# Altium footprint library myPcb.PcbLib: 145 footprints (part 7 of 10)
Each footprint in its own frame and in the unit in brackets; x right, y up, seen from the top. Pads: shape width x height; smd on the part's side, far side on the other; paste and mask are expansions set on the pad; w line width, h text height; cw(c..) or ccw(c..) is an arc to the next point about the centre after c.
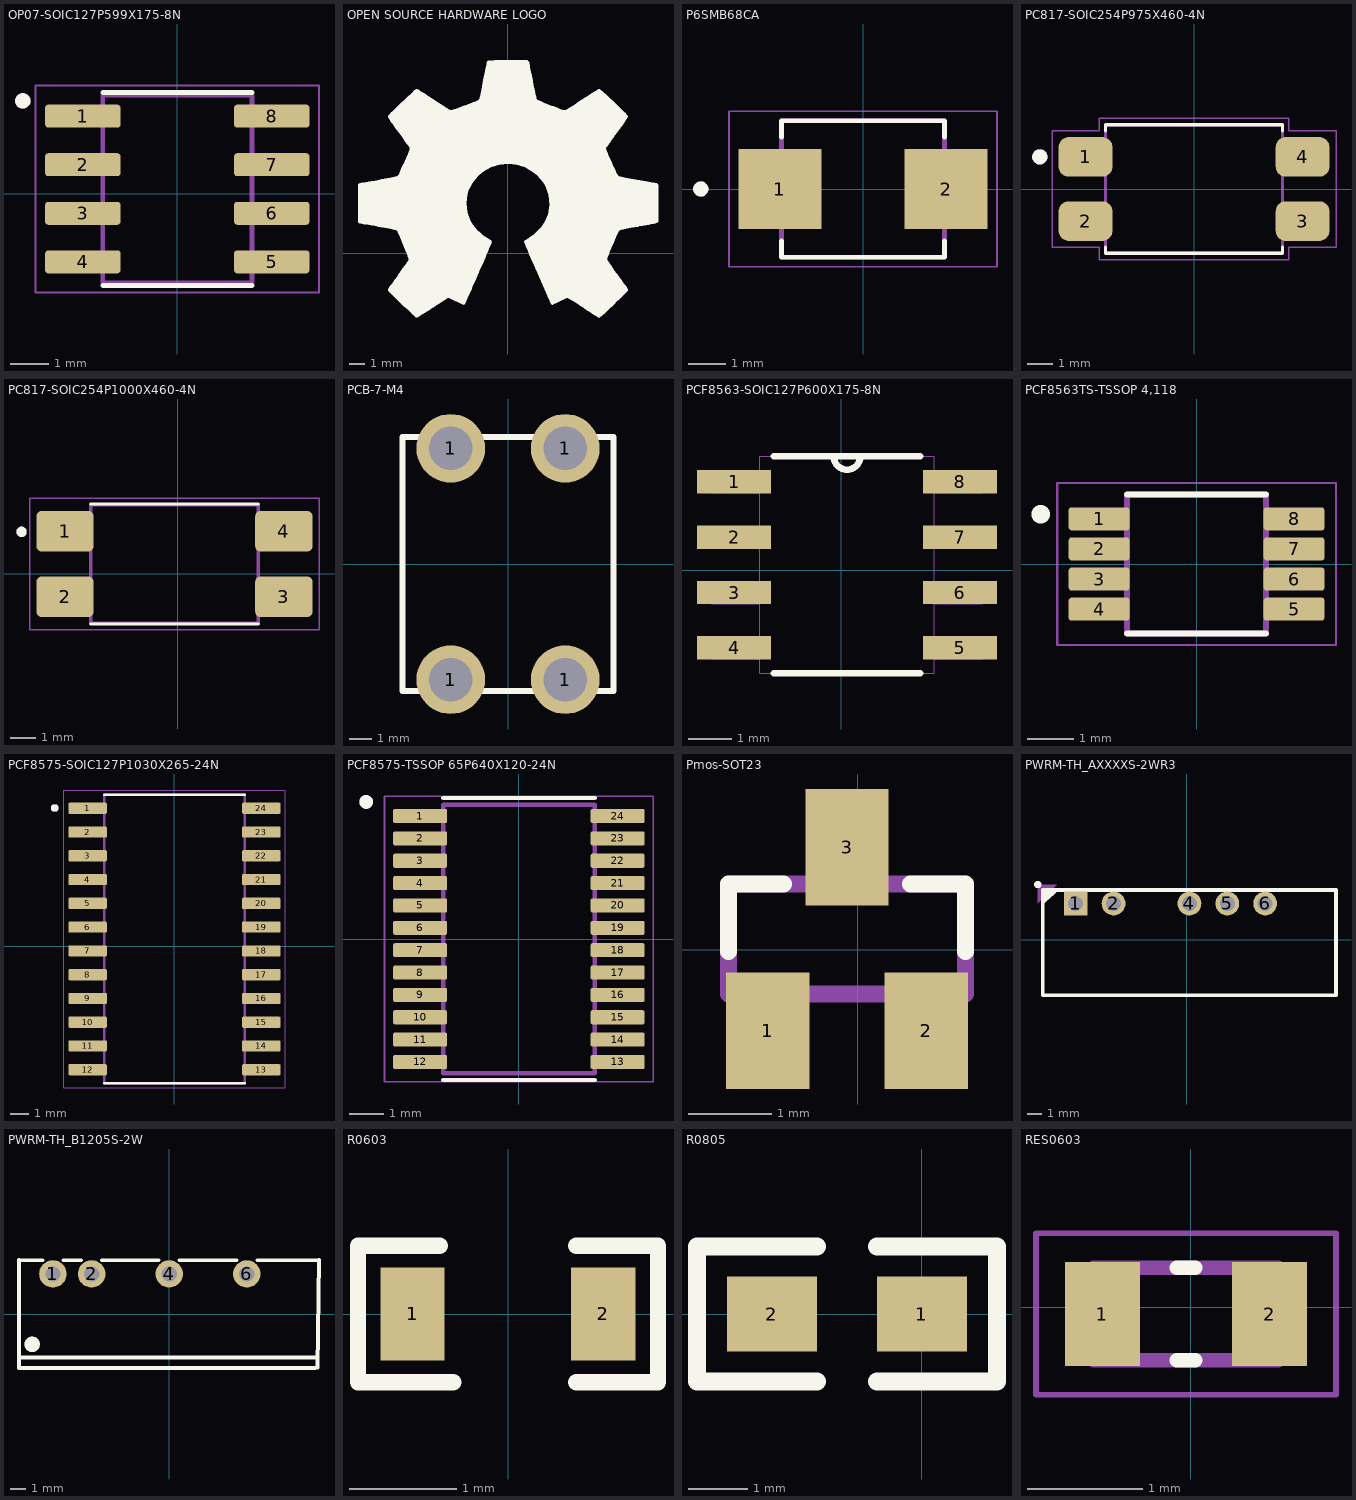
[diagram p6: the footprints below, top view; thin cyan lines are the x and y axes]

## OP07-SOIC127P599X175-8N [mm] "OP07"
pads (8):
  rrect25% 1.97x0.6 smd: 1(-2.47,2.032) 2(-2.47,0.762) 3(-2.47,-0.508) 4(-2.47,-1.778) 5(2.47,-1.778) 6(2.47,-0.508) 7(2.47,0.762) 8(2.47,2.032)
Top Overlay:
  circle w0.2: c-4.04,2.432 r0.1
  lines w0.127: -1.95,-2.398 1.95,-2.398 ; -1.95,2.652 1.95,2.652
Mechanical 13:
  circle w0.2: c-4.04,2.432 r0.1
  lines w0.127: -1.95,-2.325 1.95,-2.325 1.95,2.579 -1.95,2.579 -1.95,-2.325
Mechanical 15:
  lines w0.05: -3.705,-2.575 3.705,-2.575 3.705,2.829 -3.705,2.829 -3.705,-2.575

## OPEN SOURCE HARDWARE LOGO [mm]
Top Overlay:
  drawing of 1 lines, arcs and shapes, not listed

## P6SMB68CA [mm]
pads (2):
  rect 2.2x2.12 smd: 1(-2.205,0) 2(2.205,0)
Top Overlay:
  circle w0.2: c-4.305,0 r0.1
  lines w0.127: -2.163,-1.38 -2.163,-1.813 2.163,-1.813 2.163,-1.38 ; -2.163,1.38 -2.163,1.813 2.163,1.813 2.163,1.38
Mechanical 13:
  circle w0.2: c-4.305,0 r0.1
  lines w0.127: -2.163,-1.813 -2.163,1.813 2.163,1.813 2.163,-1.813 -2.163,-1.813
Mechanical 15:
  lines w0.05: -3.555,-2.063 -3.555,2.063 3.555,2.063 3.555,-2.063 -3.555,-2.063
3D body "step_temp.STEP": height 2.65, standoff 0, extent -2.675,-1.813 2.675,1.813

## PC817-SOIC254P975X460-4N [mm] "PC817"
pads (4):
  rrect50% 2.13x1.57 smd: 1(-4.29,1.27) 2(-4.29,-1.27) 3(4.29,-1.27) 4(4.29,1.27)
Top Overlay:
  circle w0.3: c-6.1,1.27 r0.15
  lines w0.127: -3.5,-2.304 -3.5,-2.54 3.5,-2.54 3.5,-2.304 ; -3.5,2.304 -3.5,2.54 3.5,2.54 3.5,2.304
Mechanical 13:
  circle w0.3: c-6.1,1.27 r0.15
  lines w0.127: -3.5,-2.54 3.5,-2.54 3.5,2.54 -3.5,2.54 -3.5,-2.54
Mechanical 15:
  lines w0.05: -5.61,-2.31 -3.75,-2.31 -3.75,-2.79 3.75,-2.79 3.75,-2.31 5.61,-2.31 5.61,2.31 3.75,2.31 3.75,2.79 -3.75,2.79 -3.75,2.31 -5.61,2.31 -5.61,-2.31

## PC817-SOIC254P1000X460-4N [mm] "PC817"
pads (4):
  rrect25% 2.22x1.57 smd: 1(-4.372,1.651) 2(-4.372,-0.889) 3(4.118,-0.889) 4(4.118,1.651)
Top Overlay:
  circle w0.2: c-6.057,1.628 r0.1
  lines w0.127: -3.377,-1.949 3.123,-1.949 ; -3.377,2.711 3.123,2.711
Mechanical 13:
  circle w0.2: c-6.057,1.628 r0.1
  lines w0.127: -3.377,-1.909 -3.377,2.671 3.123,2.671 3.123,-1.909 -3.377,-1.909
Mechanical 15:
  lines w0.05: -5.737,-2.169 -5.737,2.931 5.483,2.931 5.483,-2.169 -5.737,-2.169

## PCB-7-M4 [mm] "PCB安装4脚金属接线端子"
pads (4):
  round 3 hole 1.9 paste+0 mask+0.2: 1(-2.5,-5.05) 1(-2.5,5.05) 1(2.5,-5.05) 1(2.5,5.05)
Top Overlay:
  lines w0.254: -4.6,-5.55 4.6,-5.55 4.6,5.55 -4.6,5.55 -4.6,-5.55
Bottom Overlay:
  lines w0.254: -4.6,-5.55 4.6,-5.55 4.6,5.55 -4.6,5.55 -4.6,-5.55

## PCF8563-SOIC127P600X175-8N [mil] "PCF8563"
pads (8):
  rect 67x21 smd: 1(-97,80) 2(-97,30) 3(-97,-20) 4(-97,-70) 5(107,-70) 6(107,-20) 7(107,30) 8(107,80)
Top Overlay:
  lines w6: -61,-93 71,-93 ; -61,103 -7,103 ; 71,103 17,103 ; -7,103 ccw(c5,103) 17,103 ; -7,103 17,103
Mechanical 13:
  lines w0: -7,103 ccw(c5,103) 17,103 ; -7,103 -74,103 -74,-93 84,-93 84,103 17,103 ; -7,103 17,103 ; -117,-80 -74,-80 -74,-60 -117,-60 -117,-80 ; -117,-30 -74,-30 -74,-10 -117,-10 -117,-30 ; -117,20 -74,20 -74,40 -117,40 -117,20 ; -117,70 -74,70 -74,90 -117,90 -117,70 ; 84,-80 127,-80 127,-60 84,-60 84,-80 ; 84,-30 127,-30 127,-10 84,-10 84,-30 ; 84,20 127,20 127,40 84,40 84,20 ; 84,70 127,70 127,90 84,90 84,70

## PCF8563TS-TSSOP 4,118 [mm]
pads (8):
  rrect25% 1.31x0.5 smd: 1(-2.105,0.975) 2(-2.105,0.325) 3(-2.105,-0.325) 4(-2.105,-0.975) 5(2.105,-0.975) 6(2.105,-0.325) 7(2.105,0.325) 8(2.105,0.975)
Top Overlay:
  circle w0.2: c-3.366,1.074 r0.1
  lines w0.127: -1.5,-1.5 1.5,-1.5 ; -1.5,1.5 1.5,1.5
Mechanical 13:
  lines w0.127: -1.5,-1.5 -1.5,1.5 1.5,1.5 1.5,-1.5 -1.5,-1.5
Mechanical 15:
  lines w0.05: -3.01,-1.75 -3.01,1.75 3.01,1.75 3.01,-1.75 -3.01,-1.75

## PCF8575-SOIC127P1030X265-24N [mm] "PCF8575"
pads (24):
  rrect25% 2.06x0.6 smd: 1(-4.64,7.366) 2(-4.64,6.096) 3(-4.64,4.826) 4(-4.64,3.556) 5(-4.64,2.286) 6(-4.64,1.016) 7(-4.64,-0.254) 8(-4.64,-1.524) 9(-4.64,-2.794) 10(-4.64,-4.064) 11(-4.64,-5.334) 12(-4.64,-6.604) 13(4.64,-6.604) 14(4.64,-5.334) 15(4.64,-4.064) 16(4.64,-2.794) 17(4.64,-1.524) 18(4.64,-0.254) 19(4.64,1.016) 20(4.64,2.286) 21(4.64,3.556) 22(4.64,4.826) 23(4.64,6.096) 24(4.64,7.366)
Top Overlay:
  circle w0.2: c-6.4,7.381 r0.1
  lines w0.127: -3.75,-7.319 3.75,-7.319 ; -3.75,8.081 3.75,8.081
Mechanical 13:
  circle w0.2: c-6.4,7.381 r0.1
  lines w0.127: -3.75,-7.319 -3.75,8.081 3.75,8.081 3.75,-7.319 -3.75,-7.319
Mechanical 15:
  lines w0.05: -5.92,-7.569 -5.92,8.331 5.92,8.331 5.92,-7.569 -5.92,-7.569

## PCF8575-TSSOP 65P640X120-24N [mm]
pads (24):
  rrect25% 1.57x0.41 smd: 1(-2.87,3.575) 2(-2.87,2.925) 3(-2.87,2.275) 4(-2.87,1.625) 5(-2.87,0.975) 6(-2.87,0.325) 7(-2.87,-0.325) 8(-2.87,-0.975) 9(-2.87,-1.625) 10(-2.87,-2.275) 11(-2.87,-2.925) 12(-2.87,-3.575) 13(2.87,-3.575) 14(2.87,-2.925) 15(2.87,-2.275) 16(2.87,-1.625) 17(2.87,-0.975) 18(2.87,-0.325) 19(2.87,0.325) 20(2.87,0.975) 21(2.87,1.625) 22(2.87,2.275) 23(2.87,2.925) 24(2.87,3.575)
Top Overlay:
  circle w0.2: c-4.44,3.985 r0.1
  lines w0.127: -2.2,-4.1 2.2,-4.1 ; -2.2,4.1 2.2,4.1
Mechanical 13:
  circle w0.2: c-4.44,3.985 r0.1
  lines w0.127: -2.2,-3.9 2.2,-3.9 2.2,3.9 -2.2,3.9 -2.2,-3.9
Mechanical 15:
  lines w0.05: -3.905,-4.15 3.905,-4.15 3.905,4.15 -3.905,4.15 -3.905,-4.15

## Pmos-SOT23 [mm] "Single P-Channel 20V 0.2 Ohm 2.5 V (FDN336P)"
pads (3):
  rect 1x1.4 smd: 1(-1.077,-0.973) 2(0.823,-0.973) 3(-0.127,1.227)
Top Overlay:
  lines w0.203: -1.549,-0.025 -1.549,0.787 -0.891,0.787 ; 0.637,0.787 1.295,0.787 1.295,-0.025
Mechanical 13:
  region: 0.102,0.838 -0.356,0.838 -0.356,1.422 0.102,1.422
  region: 1.041,-1.169 0.584,-1.169 0.584,-0.584 1.041,-0.584
  region: -0.838,-1.17 -1.297,-1.17 -1.297,-0.584 -0.838,-0.584
  lines w0.203: -1.549,-0.533 1.295,-0.533 1.295,0.787 -1.549,0.787 -1.549,-0.533

## PWRM-TH_AXXXXS-2WR3 [mm]
pads (5):
  rect 1.6x1.6 hole 1 paste+0 mask+0.051: 1(-7.456,2.444)
  round 1.6 hole 1 paste+0 mask+0.051: 2(-4.916,2.444) 4(0.164,2.444) 5(2.704,2.444) 6(5.244,2.444)
Top Overlay:
  circle w0.254: c-9.996,3.714 r0.12
  region: -9.742,3.333 -9.742,2.317 -8.599,3.333
  lines w0.254: -9.661,-3.706 -9.661,3.344 9.989,3.344 9.989,-3.706 -9.661,-3.706
Mechanical 15:
  region: -9.996,3.714 -9.996,2.444 -8.726,3.714

## PWRM-TH_B1205S-2W [mm]
pads (4):
  round 1.8 hole 1 paste+0 mask+0.051: 1(-7.605,2.625) 2(-5.065,2.625) 4(0.015,2.625) 6(5.095,2.625)
Top Overlay:
  circle w0.5: c-8.965,-1.985 r0.25
  lines w0.254: -9.825,-2.84 9.727,-2.84 ; -8.29,3.524 -9.824,3.524 -9.825,3.525 -9.825,-3.525 9.57,-3.525 ; -6.92,3.524 -5.75,3.524 ; -4.38,3.524 -0.67,3.524 ; 0.7,3.524 4.41,3.524 ; 5.78,3.524 6.779,3.524 9.825,3.525 9.715,-3.524 9.57,-3.524
Mechanical 15:
  circle w0.5: c-8.965,-1.985 r0.25

## R0603 [mm] "R0603"
pads (2):
  rect 0.6x0.864 smd paste-100 mask+0.051: 1(-0.889,0) 2(0.888,0)
Top Overlay:
  lines w0.152: -0.635,0.635 -1.397,0.635 -1.397,-0.635 -0.509,-0.635 ; 0.634,-0.635 1.397,-0.635 1.397,0.635 0.635,0.635
Top Paste:
  region: -0.355,0.4 -0.355,0.172 -0.735,0.172 -0.735,-0.158 -0.355,-0.158 -0.355,-0.4 -0.405,-0.45 -1.195,-0.45 -1.245,-0.4 -1.245,0.4 -1.195,0.45 -0.405,0.45
  region: 1.195,0.45 0.395,0.45 0.345,0.4 0.345,0.172 0.715,0.172 0.715,-0.158 0.345,-0.158 0.345,-0.4 0.395,-0.45 1.195,-0.45 1.244,-0.4 1.244,0.4

## R0805 [mil] "R0805"
pads (2):
  rect 60x50 smd: 1(0,0) 2(-100,0)
Top Overlay:
  lines w12: -70,-45 -150,-45 -150,45 -70,45 ; -30,-45 50,-45 50,45 -30,45

## RES0603 [mm]
pads (2):
  rect 0.65x0.9 smd: 1(-0.768,-0.059) 2(0.682,-0.059)
Top Overlay:
  lines w0.127: -0.123,-0.459 0.037,-0.459 ; -0.123,0.341 0.037,0.341
Mechanical 13:
  lines w0.127: -0.843,-0.459 0.757,-0.459 0.757,0.341 -0.843,0.341 -0.843,-0.459
Mechanical 15:
  lines w0.05: -1.343,-0.759 1.257,-0.759 1.257,0.641 -1.343,0.641 -1.343,-0.759